# Altium footprint library connectors_socets.pcblib: 567 footprints (part 7 of 36)
Each footprint in its own frame and in the unit in brackets; x right, y up, seen from the top. Pads: shape width x height; smd on the part's side, far side on the other; paste and mask are expansions set on the pad; w line width, h text height; cw(c..) or ccw(c..) is an arc to the next point about the centre after c.
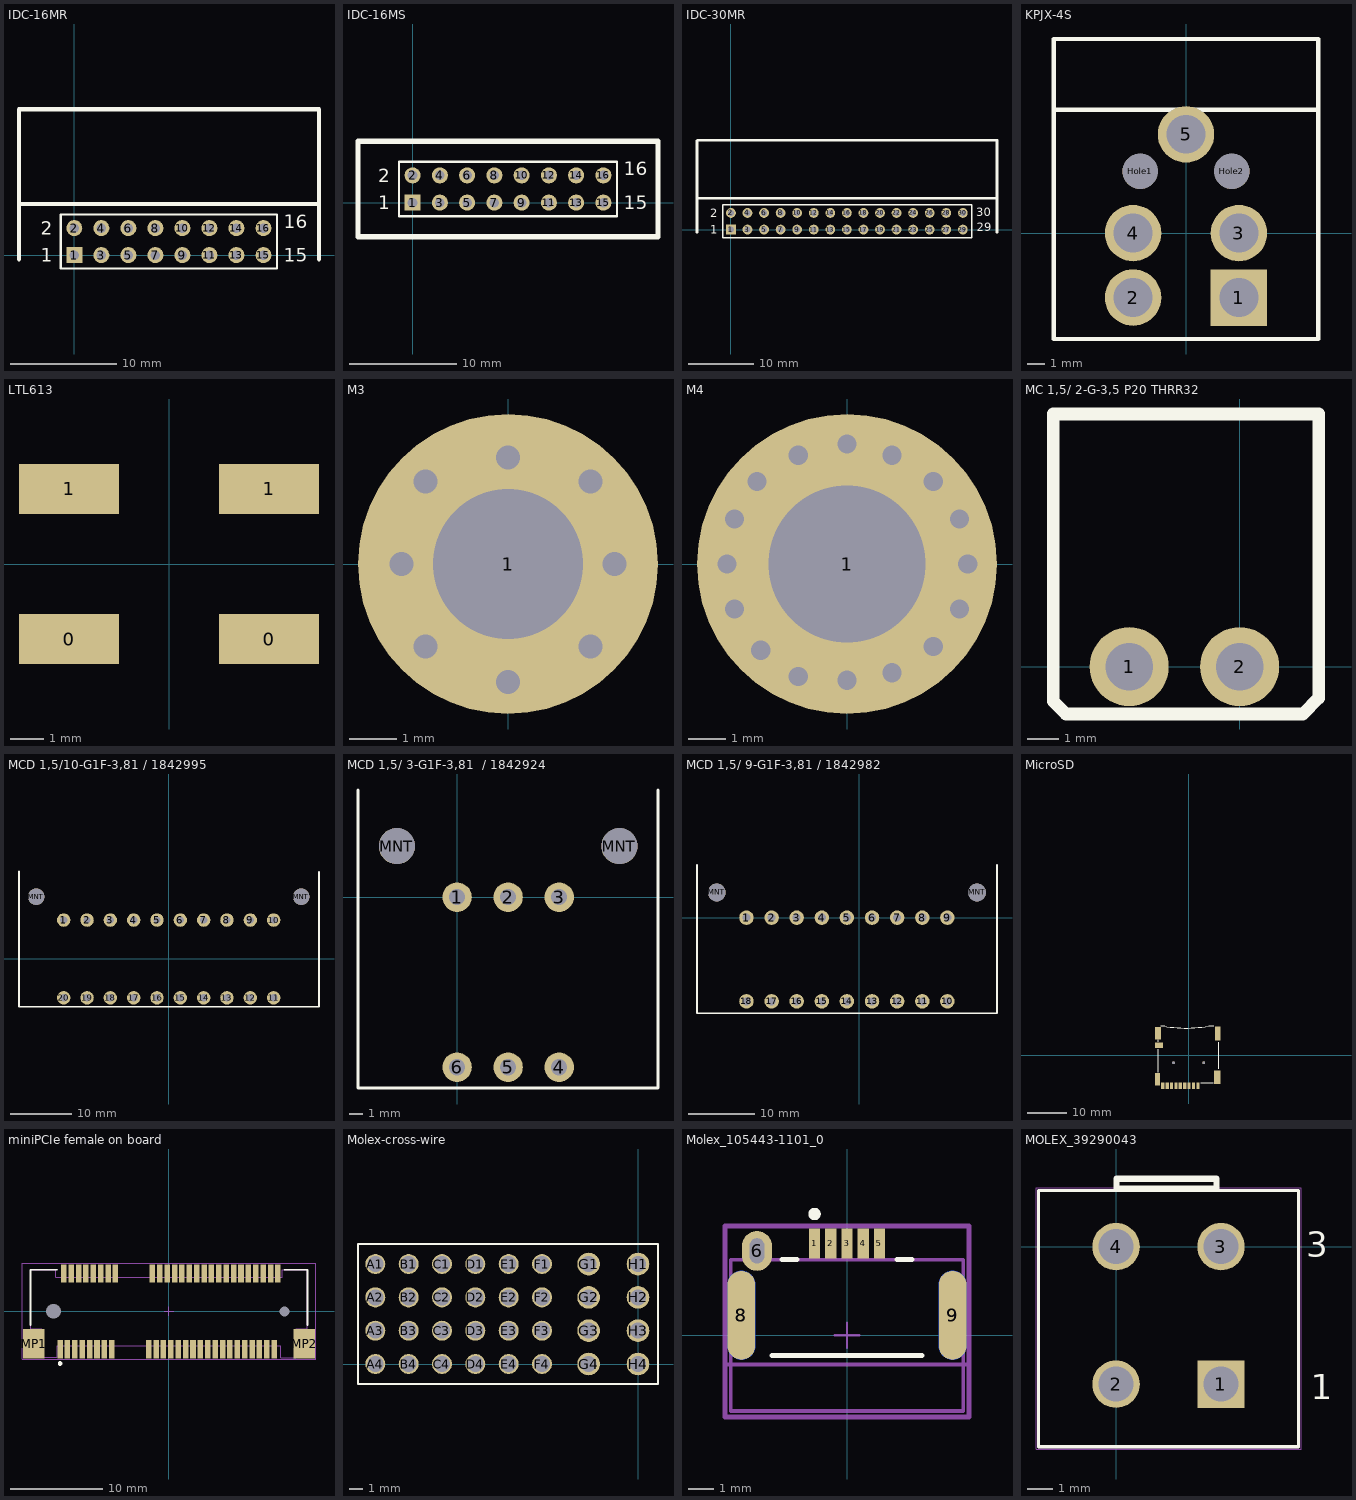
[diagram p6: the footprints below, top view; thin cyan lines are the x and y axes]

## IDC-16MR [mm]
pads (16):
  rect 1.5x1.5 hole 0.9: 1(0,0)
  round 1.5 hole 0.9: 2(0,2.54) 3(2.54,0) 4(2.54,2.54) 5(5.08,0) 6(5.08,2.54) 7(7.62,0) 8(7.62,2.54) 9(10.16,0) 10(10.16,2.54) 11(12.7,0) 12(12.7,2.54) 13(15.24,0) 14(15.24,2.54) 15(17.78,0) 16(17.78,2.54)
Top Overlay:
  lines w0.2: -1.27,-1.27 -1.27,3.81 19.05,3.81 19.05,-1.27 -1.27,-1.27
  lines w0.4: -5.2,-0.4 -5.2,13.7 23,13.7 23,-0.4 ; -5.1,4.8 22.9,4.8
  text "2" at -3.175,1.905 h1.27
  text "1" at -3.175,-0.635 h1.27
  text "15" at 19.685,-0.635 h1.27
  text "16" at 19.685,2.54 h1.27
3D body "User Library-DS1013-16R (IDC-16R CONNFLY).step": height 8.95, standoff -2.95, extent -5.17,-0.32 22.95,13.7

## IDC-16MS [mm]
pads (16):
  rect 1.5x1.5 hole 0.9: 1(0,0)
  round 1.5 hole 0.9: 2(0,2.54) 3(2.54,0) 4(2.54,2.54) 5(5.08,0) 6(5.08,2.54) 7(7.62,0) 8(7.62,2.54) 9(10.16,0) 10(10.16,2.54) 11(12.7,0) 12(12.7,2.54) 13(15.24,0) 14(15.24,2.54) 15(17.78,0) 16(17.78,2.54)
Top Overlay:
  lines w0.2: -1.27,-1.27 19.05,-1.27 19.05,3.81 -1.27,3.81 -1.27,-1.27
  lines w0.5: -5.08,-3.175 22.86,-3.175 22.86,5.715 -5.08,5.715 -5.08,-3.175
  text "16" at 19.685,2.54 h1.27
  text "15" at 19.685,-0.635 h1.27
  text "1" at -3.175,-0.635 h1.27
  text "2" at -3.175,1.905 h1.27
3D body "User Library-User Library-IDC-16M.STEP": height 9.3, standoff -3.1, extent -5.11,-3.175 22.89,5.925

## IDC-30MR [mm]
pads (30):
  rect 1.5x1.5 hole 0.9: 1(0,0)
  round 1.5 hole 0.9: 2(0,2.54) 3(2.54,0) 4(2.54,2.54) 5(5.08,0) 6(5.08,2.54) 7(7.62,0) 8(7.62,2.54) 9(10.16,0) 10(10.16,2.54) 11(12.7,0) 12(12.7,2.54) 13(15.24,0) 14(15.24,2.54) 15(17.78,0) 16(17.78,2.54) 17(20.32,0) 18(20.32,2.54) 19(22.86,0) 20(22.86,2.54) 21(25.4,0) 22(25.4,2.54) 23(27.94,0) 24(27.94,2.54) 25(30.48,0) 26(30.48,2.54) 27(33.02,0) 28(33.02,2.54) 29(35.56,0) 30(35.56,2.54)
Top Overlay:
  lines w0.2: -1.27,-1.27 36.9,-1.27 36.9,3.81 -1.27,3.81 -1.27,-1.27
  lines w0.4: -5.2,-0.4 -5.2,13.6 ; -5.2,4.8 40.8,4.8 ; -5.1,13.7 40.8,13.7 40.8,-0.4
  text "30" at 37.6,2 h1.27
  text "29" at 37.7,-0.3 h1.27
  text "1" at -3.175,-0.635 h1.27
  text "2" at -3.175,1.905 h1.27
3D body "User Library-DS1013-30R (IDC-30R CONNFLY).step": height 8.95, standoff -2.95, extent -5.17,-0.32 40.73,13.7

## KPJX-4S [mm]
height 15
pads (7):
  rect 3.2x3.2 hole 2.2: 1(3,-3.65)
  round 3.2 hole 2.2: 2(-3,-3.65) 3(3,0) 4(-3,0) 5(0,5.6)
  round 2 hole 2: Hole1(-2.6,3.5) Hole2(2.6,3.5)
Top Overlay:
  lines w0.254: -7.5,7 7.5,7 ; -7.5,7 -7.5,-6 7.5,-6 7.5,7 ; -7.5,7 -7.5,11 7.5,11 7.5,7
3D body "KPJX-4S.stp": height 15, standoff 0, extent -8,-6.5 8,11

## LTL613 [mm]
pads (4):
  rect 3x1.5 smd: 0(-3,-2.25) 0(3,-2.25) 1(-3,2.25) 1(3,2.25)
3D body "LTL613.stp": height 5, standoff 0, extent -4.039,-3 4.039,3

## M3 [mm]
pads (1):
  round 6.35 hole 3.175: 1(0,0)
via -2.25,0 diameter 0.889 hole 0.508
via 2.25,0 diameter 0.889 hole 0.508
via 0,2.25 diameter 0.889 hole 0.508
via 0,-2.5 diameter 0.889 hole 0.508
via 1.75,1.75 diameter 0.889 hole 0.508
via -1.75,1.75 diameter 0.889 hole 0.508
via -1.75,-1.75 diameter 0.889 hole 0.508
via 1.75,-1.75 diameter 0.889 hole 0.508

## M4 [mm]
pads (1):
  round 8 hole 4.2: 1(0,0)
via 2.3,-2.2 diameter 0.889 hole 0.508
via -2.3,-2.3 diameter 0.889 hole 0.508
via -2.4,2.2 diameter 0.889 hole 0.508
via 2.3,2.2 diameter 0.889 hole 0.508
via 0,-3.1 diameter 0.889 hole 0.508
via 0,3.2 diameter 0.889 hole 0.508
via 3.22,0 diameter 0.889 hole 0.508
via -3.2,0 diameter 0.889 hole 0.508
via 1.2,-2.9 diameter 0.889 hole 0.508
via 3,-1.2 diameter 0.889 hole 0.508
via 3,1.2 diameter 0.889 hole 0.508
via 1.2,2.9 diameter 0.889 hole 0.508
via -1.3,2.9 diameter 0.889 hole 0.508
via -3,1.2 diameter 0.889 hole 0.508
via -3,-1.2 diameter 0.889 hole 0.508
via -1.3,-3 diameter 0.889 hole 0.508

## MC 1,5/ 2-G-3,5 P20 THRR32 [mm]
pads (2):
  round 2.5 hole 1.5: 1(-3.5,0) 2(0,0)
Top Overlay:
  lines w0.4: -5.9,-1.1 -5.5,-1.5 2,-1.5 2.5,-1 2.5,8 -5.9,8 -5.9,-1.1
3D body "pxc_1788738_01_MC-1-5-2-G-3-5-P20-THRR32_3D.stp": height 7, standoff -1.9, extent -5.89,-1.2 2.5,8

## MCD 1,5/10-G1F-3,81 / 1842995 [mm]
pads (22):
  round 2.2 hole 1.2: 1(-17.145,6.35) 2(-13.335,6.35) 3(-9.525,6.35) 4(-5.715,6.35) 5(-1.905,6.35) 6(1.905,6.35) 7(5.715,6.35) 8(9.525,6.35) 9(13.335,6.35) 10(17.145,6.35) 11(17.145,-6.35) 12(13.335,-6.35) 13(9.525,-6.35) 14(5.715,-6.35) 15(1.905,-6.35) 16(-1.905,-6.35) 17(-5.715,-6.35) 18(-9.525,-6.35) 19(-13.335,-6.35) 20(-17.145,-6.35)
  round 2.7 hole 2.7 unplated: MNT(-21.645,10.16) MNT(21.645,10.16)
Top Overlay:
  lines w0.254: -24.445,14.35 -24.445,-7.85 24.555,-7.85 24.555,14.25
3D body "pxc_1842995_03_MCD-1-5-10-G1F-3-81_3D.stp": height 22.75, standoff -3.45, extent -24.235,-7.55 24.255,14.35

## MCD 1,5/ 3-G1F-3,81  / 1842924 [mm]
pads (8):
  round 2.2 hole 1.2: 1(0,0) 2(3.81,0) 3(7.62,0) 4(7.62,-12.7) 5(3.81,-12.7) 6(0,-12.7)
  round 2.7 hole 2.7 unplated: MNT(-4.5,3.81) MNT(12.12,3.81)
Top Overlay:
  lines w0.254: -7.4,8 -7.4,-14.25 3.6,-14.25 ; 3.2,-14.25 15,-14.25 15,8
3D body "pxc_1842924_03_MCD-1-5-3-G1F-3-81_3D.stp": height 22.75, standoff -3.45, extent -7.1,-13.9 14.72,8

## MCD 1,5/ 9-G1F-3,81 / 1842982 [mm]
pads (20):
  round 2.2 hole 1.2: 1(-17.145,0) 2(-13.335,0) 3(-9.525,0) 4(-5.715,0) 5(-1.905,0) 6(1.905,0) 7(5.715,0) 8(9.525,0) 9(13.335,0) 10(13.335,-12.7) 11(9.525,-12.7) 12(5.715,-12.7) 13(1.905,-12.7) 14(-1.905,-12.7) 15(-5.715,-12.7) 16(-9.525,-12.7) 17(-13.335,-12.7) 18(-17.145,-12.7)
  round 2.7 hole 2.7 unplated: MNT(-21.645,3.81) MNT(17.835,3.81)
Top Overlay:
  lines w0.254: -24.645,8 -24.645,-14.5 20.855,-14.5 20.855,8
3D body "pxc_1842982_03_MCD-1-5-9-G1F-3-81_3D.stp": height 22.75, standoff -3.45, extent -24.25,-13.9 20.43,8

## MicroSD [mm]
pads (16):
  rect 1.2x3.1 smd: 0(-7.79,-6.044)
  rect 1.5x3.1 smd: 0(-7.64,5.456)
  round 0.7 hole 0.7 unplated: 0(-3.74,-1.894) 0(3.81,-1.894)
  rect 1.6x3.5 smd: 0(7.21,-5.544)
  rect 1.4x3.5 smd: 0(7.313,5.463)
  rect 0.8x1.6 smd: 1(2.335,-7.694) 2(1.235,-7.694) 3(0.135,-7.694) 4(-0.965,-7.694) 5(-2.065,-7.694) 6(-3.165,-7.694) 7(-4.265,-7.694) 8(-5.365,-7.694)
  rect 0.85x1.6 smd: 9(-6.515,-7.694)
  rect 1.95x1.4 smd: 10(-7.415,2.506)
Top Overlay:
  lines w0.127: -7.62,-4.307 -7.62,1.535 ; -7.62,3.313 -7.62,3.821 ; -6.985,7.377 -5.928,7.377 ; -6.362,7.345 ccw(c-0.637,36.794) 5.087,7.345 ; 3.01,-6.969 5.735,-6.969 6.16,-6.969 ; 5.08,7.377 6.35,7.377 6.345,7.382 ; 7.62,-3.418 7.62,3.186
3D body "User Library-Socket-MicroSD-Type1-with-SDCard.step": height 1.91, standoff -0.43, extent -7.75,-7.3 6.35,12.8

## miniPCIe female on board [mm]
pads (56):
  rect 0.6x2 smd: 1(-11.8,-4.1) 2(-11.4,4.1) 3(-11,-4.1) 4(-10.6,4.1) 5(-10.2,-4.1) 6(-9.8,4.1) 7(-9.4,-4.1) 8(-9,4.1) 9(-8.6,-4.1) 10(-8.2,4.1) 11(-7.8,-4.1) 12(-7.4,4.1) 13(-7,-4.1) 14(-6.6,4.1) 15(-6.2,-4.1) 16(-5.8,4.1) 17(-2.2,-4.1) 18(-1.8,4.1) 19(-1.4,-4.1) 20(-1,4.1) 21(-0.6,-4.1) 22(-0.2,4.1) 23(0.2,-4.1) 24(0.6,4.1) 25(1,-4.1) 26(1.4,4.1) 27(1.8,-4.1) 28(2.2,4.1) 29(2.6,-4.1) 30(3,4.1) 31(3.4,-4.1) 32(3.8,4.1) 33(4.2,-4.1) 34(4.6,4.1) 35(5,-4.1) 36(5.4,4.1) 37(5.8,-4.1) 38(6.2,4.1) 39(6.6,-4.1) 40(7,4.1) 41(7.4,-4.1) 42(7.8,4.1) 43(8.2,-4.1) 44(8.6,4.1) 45(9,-4.1) 46(9.4,4.1) 47(9.8,-4.1) 48(10.2,4.1) 49(10.6,-4.1) 50(11,4.1) 51(11.4,-4.1) 52(11.8,4.1)
  round 1.3 hole 1.6 unplated: MH1(-12.5,0)
  round 0.8 hole 1.1 unplated: MH2(12.5,0)
  rect 2.3x3.2 smd: MP1(-14.65,-3.5) MP2(14.65,-3.5)
Top Overlay:
  circle w0.25: c-11.8,-5.65 r0.125
  lines w0.2: -15,-1.5 -15,4.5 -12.1,4.5 ; 12.5,4.5 15,4.5 15,-1.5
Plata3D:
  lines w0.1: -15,-1.9 -15,4.5 -12.25,4.5 -12.25,3.7 12.25,3.7 12.25,4.5 15,4.5 15,-1.9 13.79,-1.9 13.79,-5 12.1,-5 12.1,-3.7 -12.1,-3.7 -12.1,-5 -13.79,-5 -13.79,-1.9 -15,-1.9
Board3D:
  lines w0.05: -15.9,-5.2 15.9,-5.2 15.9,5.2 -15.9,5.2 -15.9,-5.2
  lines w0.1: -0.5,0 0.5,0 ; 0,-0.5 0,0.5
3D body: height 0.82, standoff 0.2, extent 15,4.5 15,4.5
3D body "292443-1.STEP": height 5.61, standoff -0.59, extent -15,-5 15,4.5

## Molex-cross-wire [mm]
height 8
pads (32):
  round 1.5 hole 1.2: A1(-19.7,7.499) A2(-19.7,4.999) A3(-19.7,2.5) A4(-19.7,0) B1(-17.2,7.499) B2(-17.2,4.999) B3(-17.2,2.5) B4(-17.2,0) C1(-14.7,7.499) C2(-14.7,4.999) C3(-14.7,2.5) C4(-14.7,0) D1(-12.2,7.499) D2(-12.2,4.999) D3(-12.2,2.5) D4(-12.2,0) E1(-9.7,7.499) E2(-9.7,4.999) E3(-9.7,2.5) E4(-9.7,0) F1(-7.2,7.499) F2(-7.2,4.999) F3(-7.2,2.5) F4(-7.2,0)
  round 1.7 hole 1.2: G1(-3.7,7.499) G2(-3.7,4.999) G3(-3.7,2.5) G4(-3.7,0) H1(0,7.499) H2(0,4.999) H3(0,2.5) H4(0,0)
Top Overlay:
  lines w0.18: -21,-1.5 1.5,-1.5 1.5,9 -21,9 -21,-1.5

## Molex_105443-1101_0 [mm]
pads (10):
  rect 0.45x1.2 smd paste+0 mask+0: 1(-1.3,3.675) 2(-0.65,3.675) 3(0,3.675) 4(0.65,3.675) 5(1.3,3.675)
  oval 1.2x1.6 hole 1 slot 0.6 at 0 deg paste-1000 mask+0: 6(-3.6,3.375)
  oval 1.1x3.55 smd paste-1000 mask+0: 8(-4.225,0.8) 9(4.225,0.8)
  oval 1.1x3.55 smd far side paste-1000 mask+0: 8(-4.225,0.8) 9(4.225,0.8)
Top Overlay:
  circle w0.25: c-1.3,4.85 r0.125
  lines w0.2: -3,-0.8 3,-0.8 ; -2.6,3.025 -2,3.025 ; 2,3.025 2.6,3.025
Mechanical 10:
  lines w0.2: -4.875,-3.275 4.875,-3.275 4.875,4.375 -4.875,4.375 -4.875,-3.275
  text ".Designator" at 0,0.55 h1
Mechanical 12:
  lines w0.15: -4.875,-1.175 4.875,-1.175 ; -4.65,-3.025 4.65,-3.025 4.65,3.025 -4.65,3.025 -4.65,-3.025
Board3D:
  lines w0.1: -0.5,0 0.5,0 ; 0,-0.5 0,0.5
  lines w0.2: -4.875,-3.275 4.875,-3.275 4.875,4.375 -4.875,4.375 -4.875,-3.275
3D body "3dmodel.step": height 0.25, standoff 0, extent -4.875,-3.275 4.875,4.375

## MOLEX_39290043 [mm]
height 12.8
pads (4):
  rect 1.9x1.9 / inner round 1.9 / far side rect 1.9x1.9 hole 1.4 mask+0.076: 1(4.2,-5.5)
  round 1.9 hole 1.4 mask+0.076: 2(0,-5.5) 3(4.2,0) 4(0,0)
Top Overlay:
  lines w0.127: -3.1,-8 -3.1,2.25 7.3,2.25 7.3,-8 -3.1,-8
  lines w0.254: 0.017,2.314 4.017,2.314 4.017,2.714 0.017,2.714 0.017,2.314
  text "1" at 7.8,-6.1 h1
  text "3" at 7.6,-0.4 h1
Plata3D:
  lines w0.127: -3.1,-8 -3.1,2.25 7.3,2.25 7.3,-8 -3.1,-8
Board3D:
  lines w0.05: -3.2,-8.1 -3.2,2.356 7.4,2.356 7.4,-8.1 -3.2,-8.1
3D body "39-29-0043--3DModel-STEP-361473.STEP": height 12.8, standoff -3.5, extent -3.1,-7.725 7.297,3.275